# Altium footprint library kalios.PcbLib: 404 footprints (part 21 of 26)
Each footprint in its own frame and in the unit in brackets; x right, y up, seen from the top. Pads: shape width x height; smd on the part's side, far side on the other; paste and mask are expansions set on the pad; w line width, h text height; cw(c..) or ccw(c..) is an arc to the next point about the centre after c.
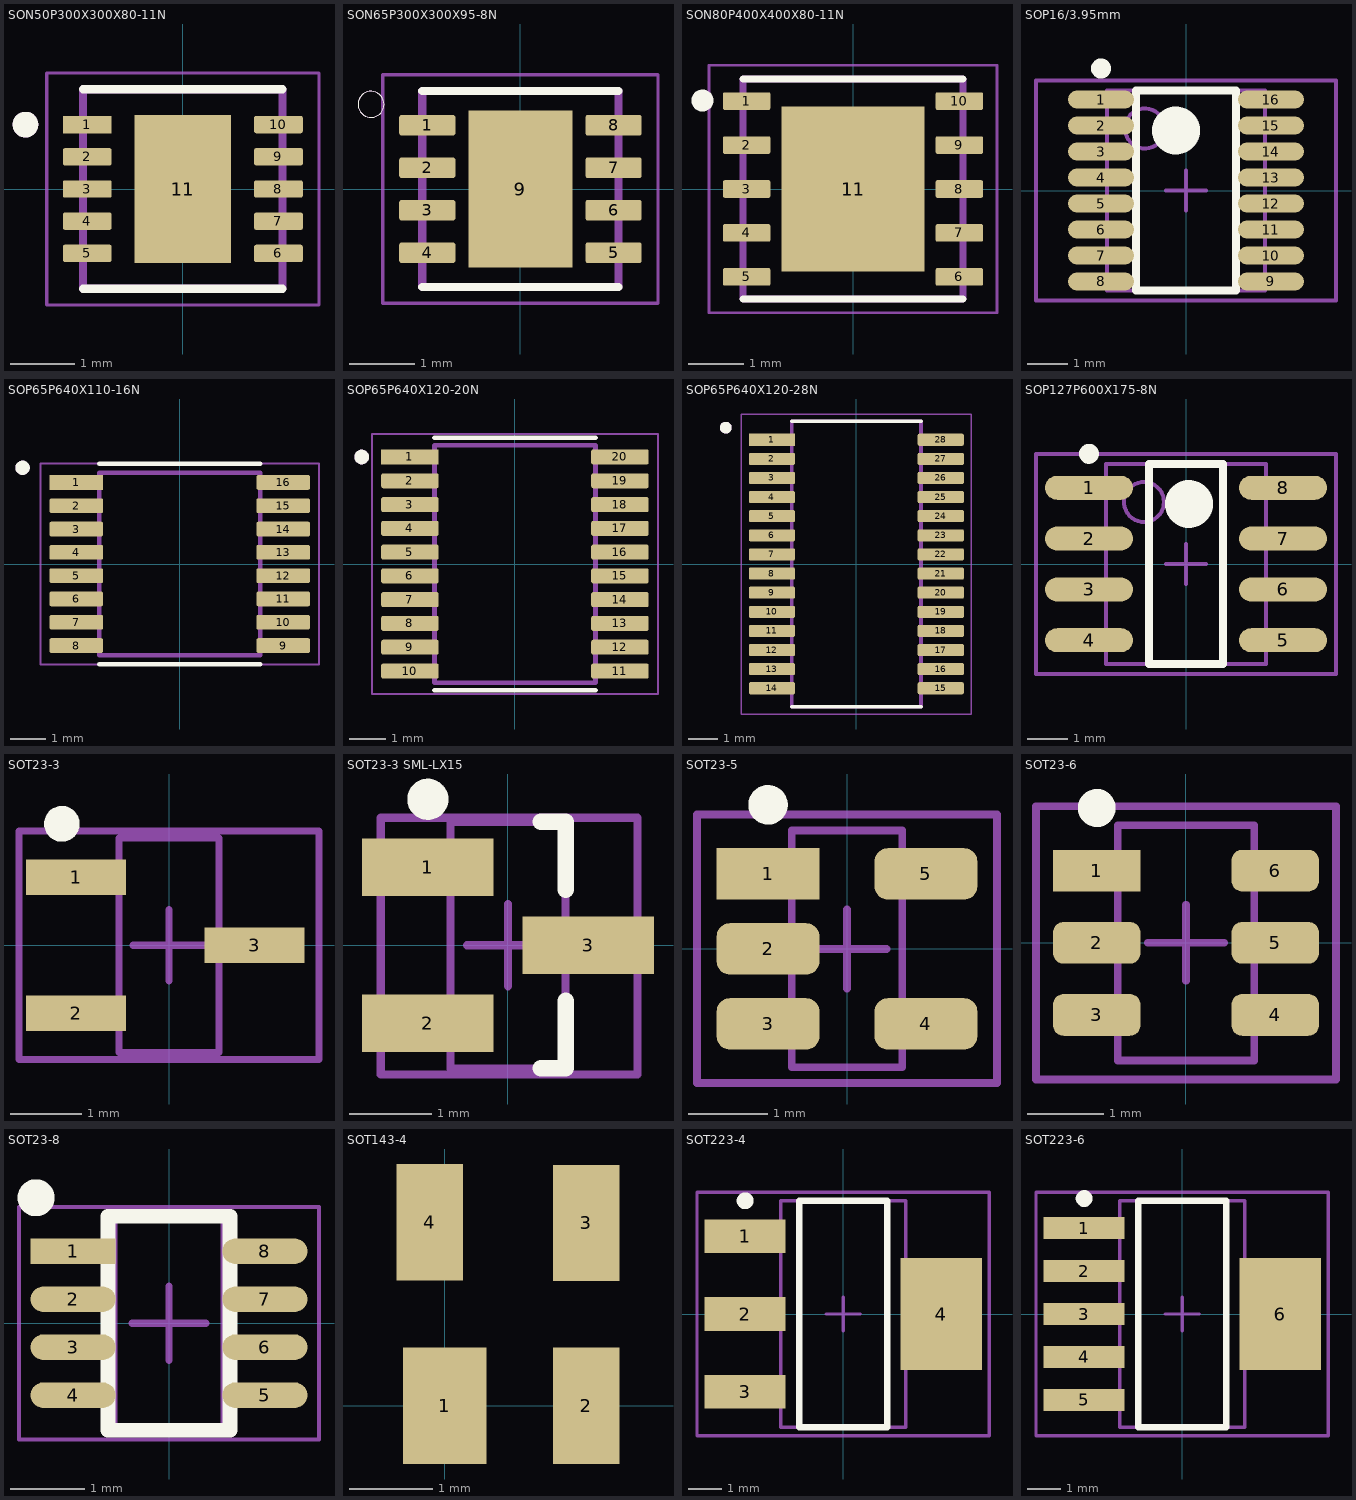
[diagram p20: the footprints below, top view; thin cyan lines are the x and y axes]

## SON50P300X300X80-11N [mm]
pads (11):
  rect 0.76x0.27 smd: 1(-1.485,1)
  rrect25% 0.76x0.27 smd: 2(-1.485,0.5) 3(-1.485,0) 4(-1.485,-0.5) 5(-1.485,-1) 6(1.485,-1) 7(1.485,-0.5) 8(1.485,0) 9(1.485,0.5) 10(1.485,1)
  rect 1.5x2.3 smd paste-2: 11(0,0)
Top Overlay:
  circle w0.2: c-2.445,1 r0.1
  lines w0.127: -1.55,-1.55 1.55,-1.55 ; -1.55,1.55 1.55,1.55
Top Paste:
  region: 0.47,-0.73 -0.47,-0.73 -0.47,0.73 0.47,0.73
Top 3D Body:
  circle w0.2: c-2.445,1 r0.1
  lines w0.127: -1.55,-1.55 1.55,-1.55 1.55,1.55 -1.55,1.55 -1.55,-1.55
Top Courtyard:
  lines w0.05: -2.115,-1.8 2.115,-1.8 2.115,1.8 -2.115,1.8 -2.115,-1.8
3D body "DFN10(3x3).STEP": height 0.76, standoff 0, extent -1.501,-1.5 1.501,1.5

## SON65P300X300X95-8N [mm]
pads (9):
  rrect25% 0.86x0.32 smd: 1(-1.425,0.975) 2(-1.425,0.325) 3(-1.425,-0.325) 4(-1.425,-0.975) 5(1.425,-0.975) 6(1.425,-0.325) 7(1.425,0.325) 8(1.425,0.975)
  rect 1.59x2.4 smd paste-2: 9(0,0)
Top Overlay:
  circle w0: c-2.285,1.295 r0.2
  lines w0.127: -1.5,-1.5 1.5,-1.5 ; -1.5,1.5 1.5,1.5
Top Paste:
  region: 0.398,-0.616 -0.408,-0.616 -0.408,0.6 0.398,0.6
Top 3D Body:
  circle w0: c-2.285,1.295 r0.2
  lines w0.127: -1.5,-1.5 -1.5,1.5 1.5,1.5 1.5,-1.5 -1.5,-1.5
Top Courtyard:
  lines w0.05: -2.105,-1.75 -2.105,1.75 2.105,1.75 2.105,-1.75 -2.105,-1.75

## SON80P400X400X80-11N [mm]
pads (11):
  rrect18% 0.86x0.32 smd: 1(-1.935,1.6) 2(-1.935,0.8) 3(-1.935,0) 4(-1.935,-0.8) 5(-1.935,-1.6) 6(1.935,-1.6) 7(1.935,-0.8) 8(1.935,0) 9(1.935,0.8) 10(1.935,1.6)
  rect 2.6x3 smd paste-3: 11(0,0)
Top Overlay:
  circle w0.2: c-2.74,1.61 r0.1
  lines w0.127: -2,-2 2,-2 ; -2,2 2,2
Top Paste:
  region: 0.822,-0.949 -0.823,-0.949 -0.823,0.948 0.822,0.948
Top 3D Body:
  lines w0.127: -2,-2 -2,2 2,2 2,-2 -2,-2
Top Courtyard:
  lines w0.05: -2.62,-2.25 -2.62,2.25 2.62,2.25 2.62,-2.25 -2.62,-2.25
3D body "NOPB.STEP": height 0.8, standoff 0, extent -2,-1.993 2,2.007

## SOP16/3.95mm [mm]
height 1.4
pads (16):
  oval 1.65x0.45 smd: 1(-2.125,2.275) 2(-2.125,1.625) 3(-2.125,0.975) 4(-2.125,0.325) 5(-2.125,-0.325) 6(-2.125,-0.975) 7(-2.125,-1.625) 8(-2.125,-2.275) 9(2.125,-2.275) 10(2.125,-1.625) 11(2.125,-0.975) 12(2.125,-0.325) 13(2.125,0.325) 14(2.125,0.975) 15(2.125,1.625) 16(2.125,2.275)
Top Overlay:
  circle w0.25: c-2.125,3.05 r0.125
  circle w0.6: c-0.25,1.5 r0.3
  lines w0.2: -1.25,-2.5 -1.25,2.5 1.25,2.5 1.25,-2.5 -1.25,-2.5
Top 3D Body:
  circle w0.1: c-1.025,1.55 r0.5
  lines w0.1: -1.975,-2.5 -1.975,2.5 1.975,2.5 1.975,-2.5 -1.975,-2.5
Top Courtyard:
  lines w0.1: -0.5,0 0.5,0 ; 0,-0.5 0,0.5 ; -3.75,-2.75 -3.75,2.75 3.75,2.75 3.75,-2.75 -3.75,-2.75
Top Designator:
  text ".Designator" at -7.817,-0.389 h1.52
3D body "User Library-ssop-16 pos.STEP": height 0.89, standoff -1.09, extent -4.199,-3.062 3.7,3.262

## SOP65P640X110-16N [mm]
pads (16):
  rect 1.5x0.41 smd: 1(-2.885,2.275)
  rrect25% 1.5x0.41 smd: 2(-2.885,1.625) 3(-2.885,0.975) 4(-2.885,0.325) 5(-2.885,-0.325) 6(-2.885,-0.975) 7(-2.885,-1.625) 8(-2.885,-2.275) 9(2.885,-2.275) 10(2.885,-1.625) 11(2.885,-0.975) 12(2.885,-0.325) 13(2.885,0.325) 14(2.885,0.975) 15(2.885,1.625) 16(2.885,2.275)
Top Overlay:
  circle w0.2: c-4.385,2.685 r0.1
  lines w0.127: -2.25,-2.8 2.25,-2.8 ; -2.25,2.8 2.25,2.8
Top 3D Body:
  circle w0.2: c-4.385,2.685 r0.1
  lines w0.127: -2.25,-2.55 2.25,-2.55 2.25,2.55 -2.25,2.55 -2.25,-2.55
Top Courtyard:
  lines w0.05: -3.885,-2.8 3.885,-2.8 3.885,2.8 -3.885,2.8 -3.885,-2.8
Top Designator:
  text ".Designator" at -7.955,-0.497 h1.52
3D body "step_temp.STEP": height 1.1, standoff 0, extent -3.2,-2.5 3.2,2.5

## SOP65P640X120-20N [mm]
pads (20):
  rect 1.57x0.41 smd: 1(-2.87,2.925)
  rrect25% 1.57x0.41 smd: 2(-2.87,2.275) 3(-2.87,1.625) 4(-2.87,0.975) 5(-2.87,0.325) 6(-2.87,-0.325) 7(-2.87,-0.975) 8(-2.87,-1.625) 9(-2.87,-2.275) 10(-2.87,-2.925) 11(2.87,-2.925) 12(2.87,-2.275) 13(2.87,-1.625) 14(2.87,-0.975) 15(2.87,-0.325) 16(2.87,0.325) 17(2.87,0.975) 18(2.87,1.625) 19(2.87,2.275) 20(2.87,2.925)
Top Overlay:
  circle w0.2: c-4.19,2.925 r0.1
  lines w0.127: -2.2,-3.45 2.2,-3.45 ; -2.2,3.45 2.2,3.45
Top 3D Body:
  circle w0.2: c-4.19,2.925 r0.1
  lines w0.127: -2.2,-3.25 2.2,-3.25 2.2,3.25 -2.2,3.25 -2.2,-3.25
Top Courtyard:
  lines w0.05: -3.91,-3.55 3.91,-3.55 3.91,3.55 -3.91,3.55 -3.91,-3.55
Top Designator:
  text ".Designator" at -7.845,-0.508 h1.52
3D body "PCM5100APWR.STEP": height 1.2, standoff 0, extent -3.225,-3.25 3.175,3.25

## SOP65P640X120-28N [mm]
pads (28):
  rect 1.57x0.41 smd: 1(-2.87,4.225)
  rrect25% 1.57x0.41 smd: 2(-2.87,3.575) 3(-2.87,2.925) 4(-2.87,2.275) 5(-2.87,1.625) 6(-2.87,0.975) 7(-2.87,0.325) 8(-2.87,-0.325) 9(-2.87,-0.975) 10(-2.87,-1.625) 11(-2.87,-2.275) 12(-2.87,-2.925) 13(-2.87,-3.575) 14(-2.87,-4.225) 15(2.87,-4.225) 16(2.87,-3.575) 17(2.87,-2.925) 18(2.87,-2.275) 19(2.87,-1.625) 20(2.87,-0.975) 21(2.87,-0.325) 22(2.87,0.325) 23(2.87,0.975) 24(2.87,1.625) 25(2.87,2.275) 26(2.87,2.925) 27(2.87,3.575) 28(2.87,4.225)
Top Overlay:
  circle w0.2: c-4.44,4.635 r0.1
  lines w0.127: -2.2,-4.85 2.2,-4.85 ; -2.2,4.85 2.2,4.85
Top 3D Body:
  circle w0.2: c-4.44,4.635 r0.1
  lines w0.127: -2.2,-4.85 -2.2,4.85 2.2,4.85 2.2,-4.85 -2.2,-4.85
Top Courtyard:
  lines w0.05: -3.905,-5.1 -3.905,5.1 3.905,5.1 3.905,-5.1 -3.905,-5.1
Top Designator:
  text ".Designator" at -7.973,-0.508 h1.52
3D body "User Library-TSSOP-28_P065.STEP": height 0.95, standoff -0.03, extent -3.2,-4.85 3.2,4.85

## SOP127P600X175-8N [mm] "SOP, 8-Leads, Body 5.0x4.0mm (max), Pitch 1.27mm, IPC Medium Density"
height 1.75
pads (8):
  oval 2.2x0.6 smd: 1(-2.425,1.905) 2(-2.425,0.635) 3(-2.425,-0.635) 4(-2.425,-1.905) 5(2.425,-1.905) 6(2.425,-0.635) 7(2.425,0.635) 8(2.425,1.905)
Top Overlay:
  circle w0.6: c0.075,1.5 r0.3
  circle w0.25: c-2.425,2.755 r0.125
  lines w0.2: -0.925,-2.5 0.925,-2.5 0.925,2.5 -0.925,2.5 -0.925,-2.5
Top 3D Body:
  circle w0.1: c-1.05,1.55 r0.5
  lines w0.1: -2,-2.5 2,-2.5 2,2.5 -2,2.5 -2,-2.5
Top Courtyard:
  lines w0.1: -0.5,0 0.5,0 ; 0,-0.5 0,0.5 ; -3.75,-2.75 3.75,-2.75 3.75,2.75 -3.75,2.75 -3.75,-2.75
Top Designator:
  text ".Designator" at -7.618,-0.405 h1.52
3D body "User Library-so8-3.STEP": height 1.7, standoff 0, extent -3,-2.45 3,2.45

## SOT23-3 [mm] "SOT23, 3-Leads, Body 3.0x2.6mm (max), Pitch 0.95mm, IPC Low Density"
height 1.1
pads (3):
  rect 1.4x0.5 smd: 1(-1.3,0.95) 2(-1.3,-0.95) 3(1.2,0)
Top Overlay:
  circle w0.25: c-1.5,1.7 r0.125
Top 3D Body:
  lines w0.1: -0.7,-1.5 0.7,-1.5 0.7,1.5 -0.7,1.5 -0.7,-1.5
Top Courtyard:
  lines w0.1: -0.5,0 0.5,0 ; 0,-0.5 0,0.5 ; -2.1,-1.6 2.1,-1.6 2.1,1.6 -2.1,1.6 -2.1,-1.6
Top Designator:
  text ".Designator" at -3.499,-0.233 h0.7
3D body "SOT23-3.STEP": height 1.46, standoff 0, extent -1.575,-1.501 1.422,1.499

## SOT23-3 SML-LX15 [mm] "SOT23, 3-Leads, Body 3.0x2.6mm (max), Pitch 0.95mm, IPC Low Density"
height 1.1
pads (3):
  rect 1.6x0.7 smd: 1(-0.975,0.95) 2(-0.975,-0.95) 3(0.975,0)
Top Overlay:
  circle w0.25: c-0.975,1.775 r0.125
  lines w0.2: 0.4,-1.5 0.7,-1.5 0.7,-0.675 ; 0.4,1.5 0.7,1.5 0.7,0.675
Top 3D Body:
  lines w0.1: -0.7,-1.5 -0.7,1.5 0.7,1.5 0.7,-1.5 -0.7,-1.5
Top Courtyard:
  lines w0.1: -0.5,0 0.5,0 ; 0,-0.5 0,0.5 ; -1.549,-1.575 -1.549,1.549 1.575,1.549 1.575,-1.575 -1.549,-1.575
Top Designator:
  text ".Designator" at -7.618,-0.308 h1.52
3D body "led.STEP": height 0.99, standoff -0.02, extent -1.51,-1.501 1.51,1.499

## SOT23-5 [mm] "SOT23, 5-Leads, Body 3.0x2.6mm (max), Pitch 0.95mm, IPC Low Density"
height 1.1
pads (5):
  rect 1.3x0.65 smd: 1(-1,0.95)
  rrect50% 1.3x0.65 smd: 2(-1,0) 3(-1,-0.95) 4(1,-0.95) 5(1,0.95)
Top Overlay:
  circle w0.25: c-1,1.825 r0.125
Top 3D Body:
  lines w0.1: -0.7,-1.5 -0.7,1.5 0.7,1.5 0.7,-1.5 -0.7,-1.5
Top Courtyard:
  lines w0.1: -0.5,0 0.5,0 ; 0,-0.5 0,0.5 ; -1.9,-1.7 -1.9,1.7 1.9,1.7 1.9,-1.7 -1.9,-1.7
Top Designator:
  text ".Designator" at -3.499,-0.221 h0.7
3D body "SOT-23-5.STEP": height 1.45, standoff -0.01, extent -1.524,-1.5 1.476,1.5

## SOT23-6 [mm] "SOT23, 6-Leads, Body 3.1x3.2mm (max), Pitch 0.95mm, IPC Medium Density"
height 1.45
pads (6):
  rect 1.15x0.55 smd: 1(-1.175,0.95)
  rrect50% 1.15x0.55 smd: 2(-1.175,0) 3(-1.175,-0.95) 4(1.175,-0.95) 5(1.175,0) 6(1.175,0.95)
Top Overlay:
  circle w0.25: c-1.175,1.775 r0.125
Top 3D Body:
  lines w0.1: -0.9,-1.55 -0.9,1.55 0.9,1.55 0.9,-1.55 -0.9,-1.55
Top Courtyard:
  lines w0.1: -0.5,0 0.5,0 ; 0,-0.5 0,0.5 ; -1.975,-1.8 -1.975,1.8 1.975,1.8 1.975,-1.8 -1.975,-1.8
Top Designator:
  text ".Designator" at -3.499,-0.146 h0.7
3D body "SOT23-6.STEP": height 1.3, standoff 0, extent -1.499,-1.5 1.501,1.5

## SOT23-8 [mm]
height 1
pads (8):
  rect 1.15x0.35 smd: 1(-1.3,0.975)
  oval 1.15x0.35 smd: 2(-1.3,0.325) 3(-1.3,-0.325) 4(-1.3,-0.975) 5(1.3,-0.975) 6(1.3,-0.325) 7(1.3,0.325) 8(1.3,0.975)
Top Overlay:
  circle w0.25: c-1.8,1.7 r0.125
  lines w0.2: -0.825,-1.45 -0.825,1.45 0.825,1.45 0.825,-1.45 -0.825,-1.45
Top 3D Body:
  lines w0.1: -0.75,-1.45 -0.75,1.45 0.75,1.45 0.75,-1.45 -0.75,-1.45
Top Courtyard:
  lines w0.05: -2.032,-1.575 -2.032,1.575 2.032,1.575 2.032,-1.575 -2.032,-1.575
  lines w0.1: -0.5,0 0.5,0 ; 0,-0.5 0,0.5
Top Designator:
  text ".Designator" at -7.618,-0.333 h1.52
3D body "User Library-sot238.STEP": height 1.2, standoff 0, extent -1.4,-1.47 1.4,1.47

## SOT143-4 [mm]
pads (4):
  rect 1x1.4 smd: 1(0,0)
  rect 0.8x1.4 smd: 2(1.7,0) 3(1.7,2.2) 4(-0.178,2.21)
Top Designator:
  text ".Designator" at -6.855,0.597 h1.52
3D body "sot143.STEP": height 1, standoff 0, extent -0.698,-0.118 2.222,2.302

## SOT223-4 [mm] "SOT223, 4-Leads, Body 6.7x7.3mm (max), Pitch 2.30mm, IPC Medium Density"
height 1.8
pads (4):
  rect 2.4x1 smd: 1(-2.9,2.3) 2(-2.9,0) 3(-2.9,-2.3)
  rect 2.4x3.3 smd: 4(2.9,0)
Top Overlay:
  circle w0.25: c-2.9,3.35 r0.125
  lines w0.2: -1.3,-3.35 -1.3,3.35 1.3,3.35 1.3,-3.35 -1.3,-3.35
Top 3D Body:
  lines w0.1: -1.85,-3.35 -1.85,3.35 1.85,3.35 1.85,-3.35 -1.85,-3.35
Top Courtyard:
  lines w0.1: -0.5,0 0.5,0 ; 0,-0.5 0,0.5 ; -4.325,-3.6 -4.325,3.6 4.325,3.6 4.325,-3.6 -4.325,-3.6
Top Designator:
  text ".Designator" at -7.618,-0.508 h1.52
3D body "User Library-SOT-223-1.STEP": height 1.64, standoff -0.01, extent -3.454,-3.225 3.546,3.275

## SOT223-6 [mm] "SOT223, 6-Leads, Body 6.7x7.3mm (max), Pitch 1.27mm, IPC Medium Density"
height 1.8
pads (6):
  rect 2.4x0.65 smd: 1(-2.9,2.54) 2(-2.9,1.27) 3(-2.9,0) 4(-2.9,-1.27) 5(-2.9,-2.54)
  rect 2.4x3.3 smd: 6(2.9,0)
Top Overlay:
  circle w0.25: c-2.9,3.415 r0.125
  lines w0.2: -1.3,-3.35 1.3,-3.35 1.3,3.35 -1.3,3.35 -1.3,-3.35
Top 3D Body:
  lines w0.1: -1.85,-3.35 1.85,-3.35 1.85,3.35 -1.85,3.35 -1.85,-3.35
Top Courtyard:
  lines w0.1: -0.5,0 0.5,0 ; 0,-0.5 0,0.5 ; -4.325,-3.6 4.325,-3.6 4.325,3.6 -4.325,3.6 -4.325,-3.6
Top Designator:
  text ".Designator" at -7.618,-0.5 h1.52
3D body "SOT223-6.STEP": height 1.7, standoff 0, extent -3.455,-3.249 3.505,3.251